# Altium footprint library Connectors Pad Lib.PcbLib: 211 footprints (part 5 of 14)
Each footprint in its own frame and in the unit in brackets; x right, y up, seen from the top. Pads: shape width x height; smd on the part's side, far side on the other; paste and mask are expansions set on the pad; w line width, h text height; cw(c..) or ccw(c..) is an arc to the next point about the centre after c.
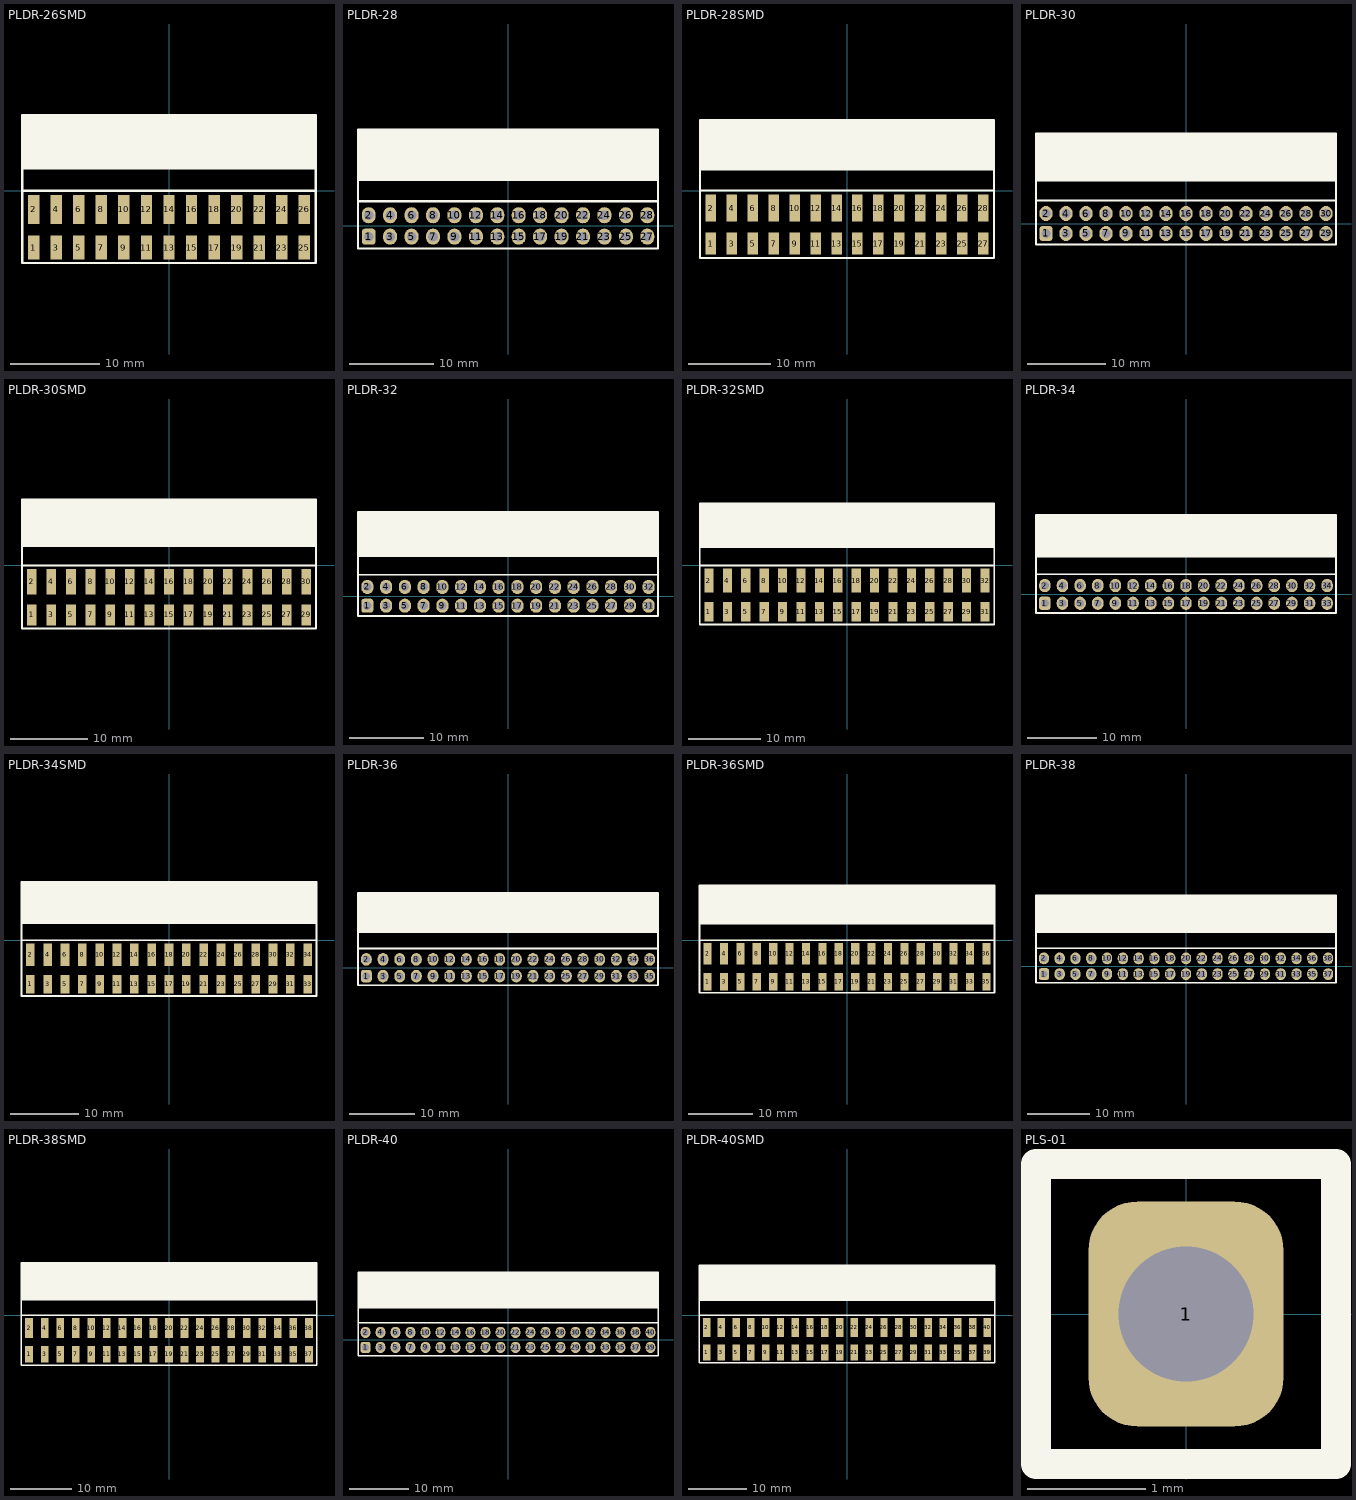
[diagram p4: the footprints below, top view; thin cyan lines are the x and y axes]

## PLDR-26SMD [mm] "PCB Right Angled Dual Connector SMD 26-Pin"
height 5.004
pads (26):
  rect 1.27x2.7 smd: 1(-15.24,-6.41) 3(-12.7,-6.41) 5(-10.16,-6.41) 7(-7.62,-6.41) 9(-5.08,-6.41) 11(-2.54,-6.41) 13(0,-6.41) 15(2.54,-6.41) 17(5.08,-6.41) 19(7.62,-6.41) 21(10.16,-6.41) 23(12.7,-6.41) 25(15.24,-6.41)
  rect 1.27x3.3 smd: 2(-15.24,-2.11) 4(-12.7,-2.11) 6(-10.16,-2.11) 8(-7.62,-2.11) 10(-5.08,-2.11) 12(-2.54,-2.11) 14(0,-2.11) 16(2.54,-2.11) 18(5.08,-2.11) 20(7.62,-2.11) 22(10.16,-2.11) 24(12.7,-2.11) 26(15.24,-2.11)
Top Overlay:
  rectangle: -16.51,2.54 16.51,8.534
  lines w0.254: -16.51,0 16.51,0 ; -16.51,2.54 16.51,2.54 ; -16.51,-8.153 16.51,-8.153 16.51,8.534 -16.51,8.534 -16.51,-8.153
3D body "PLDR_SMD-26.STEP": height 5.04, standoff 0.04, extent -16.51,-7.3 16.51,8.54

## PLDR-28 [mil] "PCB Right Angled Dual Connector 28-Pin"
height 197
pads (28):
  rrect50% 65x75 hole 45: 1(-650,-50)
  oval 65x75 hole 45: 2(-650,50) 3(-550,-50) 4(-550,50) 5(-450,-50) 6(-450,50) 7(-350,-50) 8(-350,50) 9(-250,-50) 10(-250,50) 11(-150,-50) 12(-150,50) 13(-50,-50) 14(-50,50) 15(50,-50) 16(50,50) 17(150,-50) 18(150,50) 19(250,-50) 20(250,50) 21(350,-50) 22(350,50) 23(450,-50) 24(450,50) 25(550,-50) 26(550,50) 27(650,-50) 28(650,50)
Top Overlay:
  rectangle: -700,215 700,450
  lines w10: -700,115 700,115 ; -700,215 700,215 ; -700,-105 700,-105 700,450 -700,450 -700,-105
3D body "PLDR-28.STEP": height 198.43, standoff -116.54, extent -700,-62.6 700,450.79

## PLDR-28SMD [mm] "PCB Right Angled Dual Connector SMD 28-Pin"
height 5.004
pads (28):
  rect 1.27x2.7 smd: 1(-16.51,-6.41) 3(-13.97,-6.41) 5(-11.43,-6.41) 7(-8.89,-6.41) 9(-6.35,-6.41) 11(-3.81,-6.41) 13(-1.27,-6.41) 15(1.27,-6.41) 17(3.81,-6.41) 19(6.35,-6.41) 21(8.89,-6.41) 23(11.43,-6.41) 25(13.97,-6.41) 27(16.51,-6.41)
  rect 1.27x3.3 smd: 2(-16.51,-2.11) 4(-13.97,-2.11) 6(-11.43,-2.11) 8(-8.89,-2.11) 10(-6.35,-2.11) 12(-3.81,-2.11) 14(-1.27,-2.11) 16(1.27,-2.11) 18(3.81,-2.11) 20(6.35,-2.11) 22(8.89,-2.11) 24(11.43,-2.11) 26(13.97,-2.11) 28(16.51,-2.11)
Top Overlay:
  rectangle: -17.78,2.54 17.78,8.534
  lines w0.254: -17.78,0 17.78,0 ; -17.78,2.54 17.78,2.54 ; -17.78,-8.153 -17.78,8.534 17.78,8.534 17.78,-8.153 -17.78,-8.153
3D body "PLDR_SMD-28.STEP": height 5.04, standoff 0.04, extent -17.78,-7.3 17.78,8.54

## PLDR-30 [mil] "PCB Right Angled Dual Connector 30-Pin"
height 197
pads (30):
  rrect50% 65x75 hole 45: 1(-700,-50)
  oval 65x75 hole 45: 2(-700,50) 3(-600,-50) 4(-600,50) 5(-500,-50) 6(-500,50) 7(-400,-50) 8(-400,50) 9(-300,-50) 10(-300,50) 11(-200,-50) 12(-200,50) 13(-100,-50) 14(-100,50) 15(0,-50) 16(0,50) 17(100,-50) 18(100,50) 19(200,-50) 20(200,50) 21(300,-50) 22(300,50) 23(400,-50) 24(400,50) 25(500,-50) 26(500,50) 27(600,-50) 28(600,50) 29(700,-50) 30(700,50)
Top Overlay:
  rectangle: -750,215 750,450
  lines w10: -750,115 750,115 ; -750,215 750,215 ; -750,-105 750,-105 750,450 -750,450 -750,-105
3D body "PLDR-30.STEP": height 198.43, standoff -116.54, extent -750,-62.6 750,450.79

## PLDR-30SMD [mm] "PCB Right Angled Dual Connector SMD 30-Pin"
height 5.004
pads (30):
  rect 1.27x2.7 smd: 1(-17.78,-6.41) 3(-15.24,-6.41) 5(-12.7,-6.41) 7(-10.16,-6.41) 9(-7.62,-6.41) 11(-5.08,-6.41) 13(-2.54,-6.41) 15(0,-6.41) 17(2.54,-6.41) 19(5.08,-6.41) 21(7.62,-6.41) 23(10.16,-6.41) 25(12.7,-6.41) 27(15.24,-6.41) 29(17.78,-6.41)
  rect 1.27x3.3 smd: 2(-17.78,-2.11) 4(-15.24,-2.11) 6(-12.7,-2.11) 8(-10.16,-2.11) 10(-7.62,-2.11) 12(-5.08,-2.11) 14(-2.54,-2.11) 16(0,-2.11) 18(2.54,-2.11) 20(5.08,-2.11) 22(7.62,-2.11) 24(10.16,-2.11) 26(12.7,-2.11) 28(15.24,-2.11) 30(17.78,-2.11)
Top Overlay:
  rectangle: -19.05,2.54 19.05,8.534
  lines w0.254: -19.05,0 19.05,0 ; -19.05,2.54 19.05,2.54 ; -19.05,-8.153 -19.05,8.534 19.05,8.534 19.05,-8.153 -19.05,-8.153
3D body "PLDR_SMD-30.STEP": height 5.04, standoff 0.04, extent -19.05,-7.3 19.05,8.54

## PLDR-32 [mil] "PCB Right Angled Dual Connector 32-Pin"
height 197
pads (32):
  rrect50% 65x75 hole 45: 1(-750,-50)
  oval 65x75 hole 45: 2(-750,50) 3(-650,-50) 4(-650,50) 5(-550,-50) 6(-550,50) 7(-450,-50) 8(-450,50) 9(-350,-50) 10(-350,50) 11(-250,-50) 12(-250,50) 13(-150,-50) 14(-150,50) 15(-50,-50) 16(-50,50) 17(50,-50) 18(50,50) 19(150,-50) 20(150,50) 21(250,-50) 22(250,50) 23(350,-50) 24(350,50) 25(450,-50) 26(450,50) 27(550,-50) 28(550,50) 29(650,-50) 30(650,50) 31(750,-50) 32(750,50)
Top Overlay:
  rectangle: -800,215 800,450
  lines w10: -800,115 800,115 ; -800,215 800,215 ; -800,-105 -800,450 800,450 800,-105 -800,-105
3D body "PLDR-32.STEP": height 198.43, standoff -116.54, extent -800,-62.6 800,450.79

## PLDR-32SMD [mm] "PCB Right Angled Dual Connector SMD 32-Pin"
height 5.004
pads (32):
  rect 1.27x2.7 smd: 1(-19.05,-6.41) 3(-16.51,-6.41) 5(-13.97,-6.41) 7(-11.43,-6.41) 9(-8.89,-6.41) 11(-6.35,-6.41) 13(-3.81,-6.41) 15(-1.27,-6.41) 17(1.27,-6.41) 19(3.81,-6.41) 21(6.35,-6.41) 23(8.89,-6.41) 25(11.43,-6.41) 27(13.97,-6.41) 29(16.51,-6.41) 31(19.05,-6.41)
  rect 1.27x3.3 smd: 2(-19.05,-2.11) 4(-16.51,-2.11) 6(-13.97,-2.11) 8(-11.43,-2.11) 10(-8.89,-2.11) 12(-6.35,-2.11) 14(-3.81,-2.11) 16(-1.27,-2.11) 18(1.27,-2.11) 20(3.81,-2.11) 22(6.35,-2.11) 24(8.89,-2.11) 26(11.43,-2.11) 28(13.97,-2.11) 30(16.51,-2.11) 32(19.05,-2.11)
Top Overlay:
  rectangle: -20.32,2.54 20.32,8.534
  lines w0.254: -20.32,0 20.32,0 ; -20.32,2.54 20.32,2.54 ; -20.32,-8.153 20.32,-8.153 20.32,8.534 -20.32,8.534 -20.32,-8.153
3D body "PLDR_SMD-32.STEP": height 5.04, standoff 0.04, extent -20.32,-7.3 20.32,8.54

## PLDR-34 [mil] "PCB Right Angled Dual Connector 34-Pin"
height 197
pads (34):
  rrect50% 65x75 hole 45: 1(-800,-50)
  oval 65x75 hole 45: 2(-800,50) 3(-700,-50) 4(-700,50) 5(-600,-50) 6(-600,50) 7(-500,-50) 8(-500,50) 9(-400,-50) 10(-400,50) 11(-300,-50) 12(-300,50) 13(-200,-50) 14(-200,50) 15(-100,-50) 16(-100,50) 17(0,-50) 18(0,50) 19(100,-50) 20(100,50) 21(200,-50) 22(200,50) 23(300,-50) 24(300,50) 25(400,-50) 26(400,50) 27(500,-50) 28(500,50) 29(600,-50) 30(600,50) 31(700,-50) 32(700,50) 33(800,-50) 34(800,50)
Top Overlay:
  rectangle: -850,215 850,450
  lines w10: -850,115 850,115 ; -850,215 850,215 ; -850,-105 850,-105 850,450 -850,450 -850,-105
3D body "PLDR-34.STEP": height 198.43, standoff -116.54, extent -850,-62.6 850,450.79

## PLDR-34SMD [mm] "PCB Right Angled Dual Connector SMD 34-Pin"
height 5.004
pads (34):
  rect 1.27x2.7 smd: 1(-20.32,-6.41) 3(-17.78,-6.41) 5(-15.24,-6.41) 7(-12.7,-6.41) 9(-10.16,-6.41) 11(-7.62,-6.41) 13(-5.08,-6.41) 15(-2.54,-6.41) 17(0,-6.41) 19(2.54,-6.41) 21(5.08,-6.41) 23(7.62,-6.41) 25(10.16,-6.41) 27(12.7,-6.41) 29(15.24,-6.41) 31(17.78,-6.41) 33(20.32,-6.41)
  rect 1.27x3.3 smd: 2(-20.32,-2.11) 4(-17.78,-2.11) 6(-15.24,-2.11) 8(-12.7,-2.11) 10(-10.16,-2.11) 12(-7.62,-2.11) 14(-5.08,-2.11) 16(-2.54,-2.11) 18(0,-2.11) 20(2.54,-2.11) 22(5.08,-2.11) 24(7.62,-2.11) 26(10.16,-2.11) 28(12.7,-2.11) 30(15.24,-2.11) 32(17.78,-2.11) 34(20.32,-2.11)
Top Overlay:
  rectangle: -21.59,2.54 21.59,8.534
  lines w0.254: -21.59,0 21.59,0 ; -21.59,2.54 21.59,2.54 ; -21.59,-8.153 -21.59,8.534 21.59,8.534 21.59,-8.153 -21.59,-8.153
3D body "PLDR_SMD-34.STEP": height 5.04, standoff 0.04, extent -21.59,-7.3 21.59,8.54

## PLDR-36 [mil] "PCB Right Angled Dual Connector 36-Pin"
height 197
pads (36):
  rrect50% 65x75 hole 45: 1(-850,-50)
  oval 65x75 hole 45: 2(-850,50) 3(-750,-50) 4(-750,50) 5(-650,-50) 6(-650,50) 7(-550,-50) 8(-550,50) 9(-450,-50) 10(-450,50) 11(-350,-50) 12(-350,50) 13(-250,-50) 14(-250,50) 15(-150,-50) 16(-150,50) 17(-50,-50) 18(-50,50) 19(50,-50) 20(50,50) 21(150,-50) 22(150,50) 23(250,-50) 24(250,50) 25(350,-50) 26(350,50) 27(450,-50) 28(450,50) 29(550,-50) 30(550,50) 31(650,-50) 32(650,50) 33(750,-50) 34(750,50) 35(850,-50) 36(850,50)
Top Overlay:
  rectangle: -900,215 900,450
  lines w10: -900,115 900,115 ; -900,215 900,215 ; -900,-105 900,-105 900,450 -900,450 -900,-105
3D body "PLDR-36.STEP": height 198.43, standoff -116.54, extent -900,-62.6 900,450.79

## PLDR-36SMD [mm] "PCB Right Angled Dual Connector SMD 36-Pin"
height 5.004
pads (36):
  rect 1.27x2.7 smd: 1(-21.59,-6.41) 3(-19.05,-6.41) 5(-16.51,-6.41) 7(-13.97,-6.41) 9(-11.43,-6.41) 11(-8.89,-6.41) 13(-6.35,-6.41) 15(-3.81,-6.41) 17(-1.27,-6.41) 19(1.27,-6.41) 21(3.81,-6.41) 23(6.35,-6.41) 25(8.89,-6.41) 27(11.43,-6.41) 29(13.97,-6.41) 31(16.51,-6.41) 33(19.05,-6.41) 35(21.59,-6.41)
  rect 1.27x3.3 smd: 2(-21.59,-2.11) 4(-19.05,-2.11) 6(-16.51,-2.11) 8(-13.97,-2.11) 10(-11.43,-2.11) 12(-8.89,-2.11) 14(-6.35,-2.11) 16(-3.81,-2.11) 18(-1.27,-2.11) 20(1.27,-2.11) 22(3.81,-2.11) 24(6.35,-2.11) 26(8.89,-2.11) 28(11.43,-2.11) 30(13.97,-2.11) 32(16.51,-2.11) 34(19.05,-2.11) 36(21.59,-2.11)
Top Overlay:
  rectangle: -22.86,2.54 22.86,8.534
  lines w0.254: -22.86,0 22.86,0 ; -22.86,2.54 22.86,2.54 ; -22.86,-8.153 22.86,-8.153 22.86,8.534 -22.86,8.534 -22.86,-8.153
3D body "PLDR_SMD-36.STEP": height 5.04, standoff 0.04, extent -22.86,-7.3 22.86,8.54

## PLDR-38 [mil] "PCB Right Angled Dual Connector 38-Pin"
height 197
pads (38):
  rrect50% 65x75 hole 45: 1(-900,-50)
  oval 65x75 hole 45: 2(-900,50) 3(-800,-50) 4(-800,50) 5(-700,-50) 6(-700,50) 7(-600,-50) 8(-600,50) 9(-500,-50) 10(-500,50) 11(-400,-50) 12(-400,50) 13(-300,-50) 14(-300,50) 15(-200,-50) 16(-200,50) 17(-100,-50) 18(-100,50) 19(0,-50) 20(0,50) 21(100,-50) 22(100,50) 23(200,-50) 24(200,50) 25(300,-50) 26(300,50) 27(400,-50) 28(400,50) 29(500,-50) 30(500,50) 31(600,-50) 32(600,50) 33(700,-50) 34(700,50) 35(800,-50) 36(800,50) 37(900,-50) 38(900,50)
Top Overlay:
  rectangle: -950,215 950,450
  lines w10: -950,115 950,115 ; -950,215 950,215 ; -950,-105 950,-105 950,450 -950,450 -950,-105
3D body "PLDR-38.STEP": height 198.43, standoff -116.54, extent -950,-62.6 950,450.79

## PLDR-38SMD [mm] "PCB Right Angled Dual Connector SMD 38-Pin"
height 5.004
pads (38):
  rect 1.27x2.7 smd: 1(-22.86,-6.41) 3(-20.32,-6.41) 5(-17.78,-6.41) 7(-15.24,-6.41) 9(-12.7,-6.41) 11(-10.16,-6.41) 13(-7.62,-6.41) 15(-5.08,-6.41) 17(-2.54,-6.41) 19(0,-6.41) 21(2.54,-6.41) 23(5.08,-6.41) 25(7.62,-6.41) 27(10.16,-6.41) 29(12.7,-6.41) 31(15.24,-6.41) 33(17.78,-6.41) 35(20.32,-6.41) 37(22.86,-6.41)
  rect 1.27x3.3 smd: 2(-22.86,-2.11) 4(-20.32,-2.11) 6(-17.78,-2.11) 8(-15.24,-2.11) 10(-12.7,-2.11) 12(-10.16,-2.11) 14(-7.62,-2.11) 16(-5.08,-2.11) 18(-2.54,-2.11) 20(0,-2.11) 22(2.54,-2.11) 24(5.08,-2.11) 26(7.62,-2.11) 28(10.16,-2.11) 30(12.7,-2.11) 32(15.24,-2.11) 34(17.78,-2.11) 36(20.32,-2.11) 38(22.86,-2.11)
Top Overlay:
  rectangle: -24.13,2.54 24.13,8.534
  lines w0.254: -24.13,0 24.13,0 ; -24.13,2.54 24.13,2.54 ; -24.13,-8.153 -24.13,8.534 24.13,8.534 24.13,-8.153 -24.13,-8.153
3D body "PLDR_SMD-38.STEP": height 5.04, standoff 0.04, extent -24.13,-7.3 24.13,8.54

## PLDR-40 [mil] "PCB Right Angled Dual Connector 40-Pin"
height 197
pads (40):
  rrect50% 65x75 hole 45: 1(-950,-50)
  oval 65x75 hole 45: 2(-950,50) 3(-850,-50) 4(-850,50) 5(-750,-50) 6(-750,50) 7(-650,-50) 8(-650,50) 9(-550,-50) 10(-550,50) 11(-450,-50) 12(-450,50) 13(-350,-50) 14(-350,50) 15(-250,-50) 16(-250,50) 17(-150,-50) 18(-150,50) 19(-50,-50) 20(-50,50) 21(50,-50) 22(50,50) 23(150,-50) 24(150,50) 25(250,-50) 26(250,50) 27(350,-50) 28(350,50) 29(450,-50) 30(450,50) 31(550,-50) 32(550,50) 33(650,-50) 34(650,50) 35(750,-50) 36(750,50) 37(850,-50) 38(850,50) 39(950,-50) 40(950,50)
Top Overlay:
  rectangle: -1000,215 1000,450
  lines w10: -1000,115 1000,115 ; -1000,215 1000,215 ; -1000,-105 -1000,450 1000,450 1000,-105 -1000,-105
3D body "PLDR-40.STEP": height 198.43, standoff -116.54, extent -1000,-62.6 1000,450.79

## PLDR-40SMD [mm] "PCB Right Angled Dual Connector SMD 40-Pin"
height 5.004
pads (40):
  rect 1.27x2.7 smd: 1(-24.13,-6.41) 3(-21.59,-6.41) 5(-19.05,-6.41) 7(-16.51,-6.41) 9(-13.97,-6.41) 11(-11.43,-6.41) 13(-8.89,-6.41) 15(-6.35,-6.41) 17(-3.81,-6.41) 19(-1.27,-6.41) 21(1.27,-6.41) 23(3.81,-6.41) 25(6.35,-6.41) 27(8.89,-6.41) 29(11.43,-6.41) 31(13.97,-6.41) 33(16.51,-6.41) 35(19.05,-6.41) 37(21.59,-6.41) 39(24.13,-6.41)
  rect 1.27x3.3 smd: 2(-24.13,-2.11) 4(-21.59,-2.11) 6(-19.05,-2.11) 8(-16.51,-2.11) 10(-13.97,-2.11) 12(-11.43,-2.11) 14(-8.89,-2.11) 16(-6.35,-2.11) 18(-3.81,-2.11) 20(-1.27,-2.11) 22(1.27,-2.11) 24(3.81,-2.11) 26(6.35,-2.11) 28(8.89,-2.11) 30(11.43,-2.11) 32(13.97,-2.11) 34(16.51,-2.11) 36(19.05,-2.11) 38(21.59,-2.11) 40(24.13,-2.11)
Top Overlay:
  rectangle: -25.4,2.54 25.4,8.534
  lines w0.254: -25.4,0 25.4,0 ; -25.4,2.54 25.4,2.54 ; -25.4,-8.153 25.4,-8.153 25.4,8.534 -25.4,8.534 -25.4,-8.153
3D body "PLDR_SMD-40.STEP": height 5.04, standoff 0.04, extent -25.4,-7.3 25.4,8.54

## PLS-01 [mil] "PCB Vertical Single Connector 1-Pin"
height 336.22
pads (1):
  rrect50% 65x75 hole 45: 1(0,0)
Top Overlay:
  lines w10: -50,-50 50,-50 50,50 -50,50 -50,-50
3D body "PLS-01.STEP": height 337.22, standoff -117.11, extent -50,-50 50,50